# Altium footprint library IS12.01.02.PcbLib: 38 footprints (part 1 of 3)
Each footprint in its own frame and in the unit in brackets; x right, y up, seen from the top. Pads: shape width x height; smd on the part's side, far side on the other; paste and mask are expansions set on the pad; w line width, h text height; cw(c..) or ccw(c..) is an arc to the next point about the centre after c.
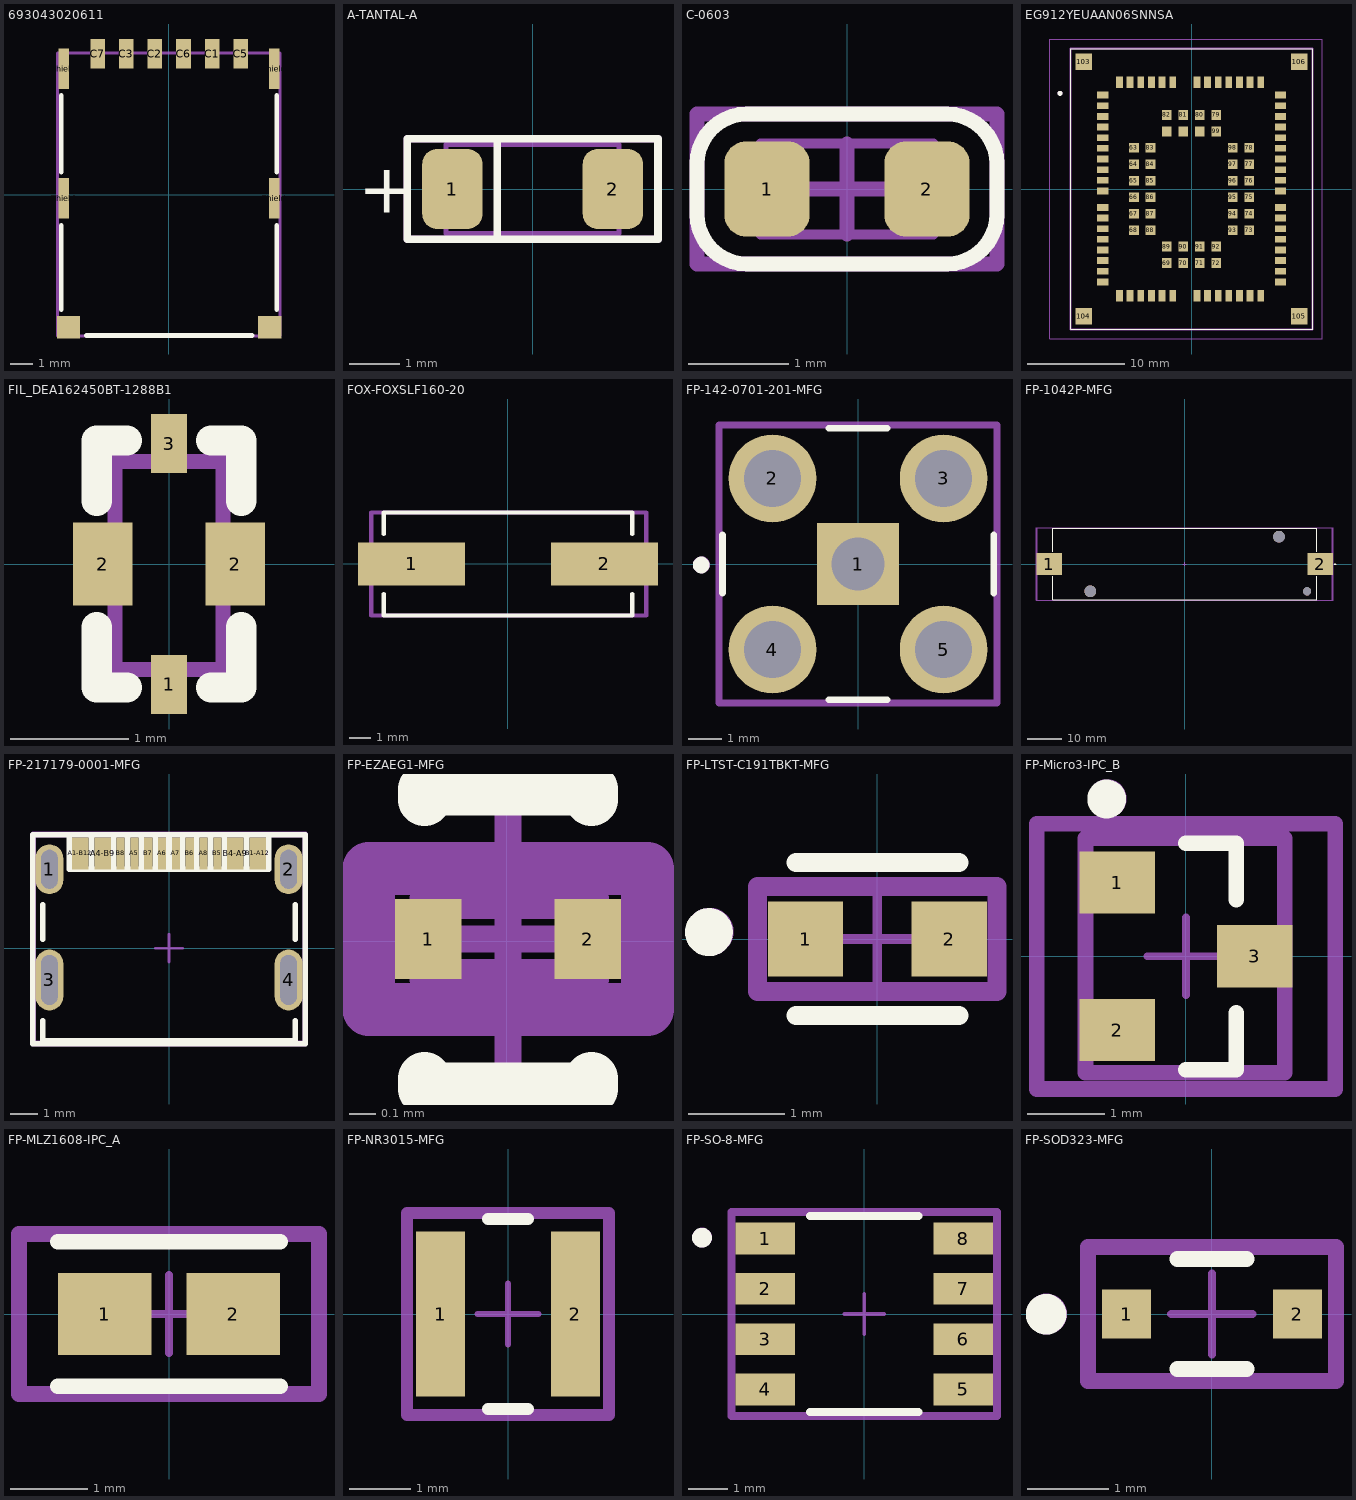
[diagram p0: the footprints below, top view; thin cyan lines are the x and y axes]

## 693043020611 [mm]
pads (12):
  rect 0.65x1.3 smd mask+0.051: C1(1.915,6.25) C2(-0.625,6.25) C3(-1.895,6.25) C5(3.185,6.25) C6(0.645,6.25) C7(-3.165,6.25)
  rect 0.48x1.8 smd mask+0.051: Shield(-4.665,-0.17) Shield(-4.665,5.58) Shield(4.665,-0.17) Shield(4.665,5.58)
  rect 1.03x1 smd mask+0.051: Shield(-4.46,-5.89) Shield(4.47,-5.89)
Top Overlay:
  lines w0.2: -4.775,-5.1 -4.775,-1.35 ; -4.775,1 -4.775,4.4 ; -3.665,-6.25 3.685,-6.25 ; 4.785,-5.1 4.785,-1.35 ; 4.785,1 4.785,4.4
Top Assembly:
  lines w0.127: -4.953,-6.274 4.928,-6.274 4.928,6.274 -4.953,6.274 -4.953,-6.274
3D body "693043020611.stp": height 1.2, standoff -0.01, extent -4.925,-6.25 4.936,6.25

## A-TANTAL-A [mm]
pads (2):
  rrect50% 1.2x1.6 smd mask+0.051: 1(-1.6,0) 2(1.6,0)
Top Overlay:
  lines w0.15: -0.7,-1 -0.7,1 ; -2.5,-1 -2.5,1 2.5,1 2.5,-1 -2.5,-1
  text "+" at -3.479,-0.475 h1
Top Assembly:
  lines w0.1: -1.727,-0.889 -1.727,0.889 1.727,0.889 1.727,-0.889 -1.727,-0.889
  text "+" at -3.479,-0.475 h1
Top Component Outline:
  lines w0.15: -2.5,-1 2.5,-1 2.5,1 -2.5,1 -2.5,-1
3D body "User Library-AVX_ACASE.STEP": height 1.71, standoff 0, extent -1.7,-0.84 1.7,0.84

## C-0603 [mm]
pads (2):
  rrect50% 0.85x0.95 smd: 1(-0.8,0) 2(0.8,0)
Top Overlay:
  lines w0.15: -1.5,-0.25 ccw(c-1,-0.25) -1,-0.75 1,-0.75 ccw(c1,-0.25) 1.5,-0.25 1.5,0.25 ccw(c1,0.25) 1,0.75 -1,0.75 ccw(c-1,0.25) -1.5,0.25 -1.5,-0.25
Top Assembly:
  lines w0.1: -0.864,-0.457 -0.864,0.457 0.864,0.457 0.864,-0.457 -0.864,-0.457
Top Component Outline:
  lines w0.15: -0.45,0 0.45,0 ; 0,-0.45 0,0.45 ; -1.5,-0.75 -1.5,0.75 1.5,0.75 1.5,-0.75 -1.5,-0.75
3D body "CAPC-0603-T0.9-BN.stp": height 0.9, standoff 0, extent -0.85,-0.45 0.85,0.45

## EG912YEUAAN06SNNSA [mm]
pads (106):
  rect 1.15x0.7 smd: 1(-9.175,9.7) 2(-9.175,8.6) 3(-9.175,7.5) 4(-9.175,6.4) 5(-9.175,5.3) 6(-9.175,4.2) 7(-9.175,3.1) 8(-9.175,2) 9(-9.175,0.9) 10(-9.175,-0.2) 11(-9.175,-1.9) 12(-9.175,-3) 13(-9.175,-4.1) 14(-9.175,-5.2) 15(-9.175,-6.3) 16(-9.175,-7.4) 17(-9.175,-8.5) 18(-9.175,-9.6) 32(9.175,-9.6) 33(9.175,-8.5) 34(9.175,-7.4) 35(9.175,-6.3) 36(9.175,-5.2) 37(9.175,-4.1) 38(9.175,-3) 39(9.175,-1.9) 40(9.175,-0.2) 41(9.175,0.9) 42(9.175,2) 43(9.175,3.1) 44(9.175,4.2) 45(9.175,5.3) 46(9.175,6.4) 47(9.175,7.5) 48(9.175,8.6) 49(9.175,9.7)
  rect 0.7x1.15 smd: 19(-7.45,-11.025) 20(-6.35,-11.025) 21(-5.25,-11.025) 22(-4.15,-11.025) 23(-3.05,-11.025) 24(-1.95,-11.025) 25(0.55,-11.025) 26(1.65,-11.025) 27(2.75,-11.025) 28(3.85,-11.025) 29(4.95,-11.025) 30(6.05,-11.025) 31(7.15,-11.025) 50(7.15,11.025) 51(6.05,11.025) 52(4.95,11.025) 53(3.85,11.025) 54(2.75,11.025) 55(1.65,11.025) 56(0.55,11.025) 57(-1.95,11.025) 58(-3.05,11.025) 59(-4.15,11.025) 60(-5.25,11.025) 61(-6.35,11.025) 62(-7.45,11.025)
  rect 1x1 smd: 63(-5.95,4.25) 64(-5.95,2.55) 65(-5.95,0.85) 66(-5.95,-0.85) 67(-5.95,-2.55) 68(-5.95,-4.25) 69(-2.55,-7.65) 70(-0.85,-7.65) 71(0.85,-7.65) 72(2.55,-7.65) 73(5.95,-4.25) 74(5.95,-2.55) 75(5.95,-0.85) 76(5.95,0.85) 77(5.95,2.55) 78(5.95,4.25) 79(2.55,7.65) 80(0.85,7.65) 81(-0.85,7.65) 82(-2.55,7.65) 83(-4.25,4.25) 84(-4.25,2.55) 85(-4.25,0.85) 86(-4.25,-0.85) 87(-4.25,-2.55) 88(-4.25,-4.25) 89(-2.55,-5.95) 90(-0.85,-5.95) 91(0.85,-5.95) 92(2.55,-5.95) 93(4.25,-4.25) 94(4.25,-2.55) 95(4.25,-0.85) 96(4.25,0.85) 97(4.25,2.55) 98(4.25,4.25) 99(2.55,5.95) 100(0.85,5.95) 101(-0.85,5.95) 102(-2.55,5.95)
  rect 1.7x1.7 smd: 103(-11.15,13.15) 104(-11.15,-13.15) 105(11.15,-13.15) 106(11.15,13.15)
Top Overlay:
  circle w0.25: c-13.595,9.876 r0.125
  lines w0.1: -12.5,-14.5 12.5,-14.5 12.5,14.5 -12.5,14.5 -12.5,-14.5
Top Assembly:
  circle w0.25: c-13.589,9.881 r0.125
  lines w0.2: -12.5,-14.5 12.5,-14.5 12.5,14.5 -12.5,14.5 -12.5,-14.5
Mechanical 20:
  lines w0.1: -14.65,-15.5 13.5,-15.5 13.5,15.5 -14.65,15.5 -14.65,-15.5
3D body "EG912YEUAA-N06-SNNSA.STEP": height 2.25, standoff 0, extent -12.5,-14.5 12.5,14.5

## FIL_DEA162450BT-1288B1 [mm]
pads (4):
  rect 0.3x0.5 smd mask+0.05: 1(0,-1.016) 3(0,1.016)
  rect 0.5x0.7 smd mask+0.05: 2(-0.559,0) 2(0.559,0)
Top Overlay:
  lines w0.254: -0.61,-0.533 -0.61,-1.041 -0.356,-1.041 ; -0.61,0.533 -0.61,1.041 -0.356,1.041 ; 0.356,-1.041 0.61,-1.041 0.61,-0.533 ; 0.356,1.041 0.61,1.041 0.61,0.533
Top Assembly:
  lines w0.127: -0.457,-0.889 0.457,-0.889 0.457,0.864 -0.457,0.864 -0.457,-0.889
3D body "DEA-4_1P6X0P8.step": height 0.61, standoff 0, extent -0.47,-0.876 0.47,0.876

## FOX-FOXSLF160-20 [mm]
pads (2):
  rect 5x2 smd: 1(-4.5,0) 2(4.5,0)
Top Overlay:
  lines w0.2: -5.8,-1.4 -5.8,-2.4 0,-2.4 5.8,-2.4 5.8,-1.4 ; -5.8,1.4 -5.8,2.4 0,2.4 5.8,2.4 5.8,1.4
Top Assembly:
  lines w0.2: -6.375,-2.4 6.452,-2.4 6.452,2.4 -6.375,2.4 -6.375,-2.4
3D body "User Library-Crystal HC49_US-SM.STEP": height 4.35, standoff 0.05, extent -6.4,-2.415 6.4,2.415

## FP-142-0701-201-MFG [mil]
pads (5):
  rect 95.46x95.46 hole 62 paste-39370.1 mask+0: 1(0,0)
  round 102.43 hole 67 paste-39370.1 mask+0: 2(-100,100) 3(100,100) 4(-100,-100) 5(100,-100)
Top Overlay:
  circle w9.84: c-183.24,-1.17 r4.92
  lines w7.87: -158.5,-34.02 -158.5,34.02 ; -34.02,-158.5 34.02,-158.5 ; -34.02,158.5 34.02,158.5 ; 158.5,-34.02 158.5,34.02
Top Assembly:
  circle w9.84: c-183,-1 r4.92
  lines w7.87: -162.44,-162.44 162.44,-162.44 162.44,162.44 -162.44,162.44 -162.44,-162.44
Top Courtyard:
  lines w7.87: -162.44,-162.44 162.44,-162.44 162.44,162.44 -162.44,162.44 -162.44,-162.44
Top Component Center:
  lines w3.94: -19.68,0 19.68,0 ; 0,-19.68 0,19.68
3D body "Conn_Cinch_Connectivity_Solutions_142-0701-201_eec.STEP": height 10, standoff 0, extent -162.44,-162.44 162.44,162.44

## FP-1042P-MFG [mil]
pads (5):
  rect 294x255 smd paste+0 mask+0: 1(-1562.5,0) 2(1562.5,0)
  round 135.83 hole 135.83 unplated paste-39370.1 mask+0: ""(-1087.5,-315) ""(1087.5,315)
  round 94 hole 94 unplated paste-39370.1 mask+0: ""(1411.5,-315)
Top Overlay:
  lines w7.87: -1522,-142.13 -1522,-411.5 1522,-411.5 1522,-142.13 ; -1522,142.13 -1522,411.5 1522,411.5 1522,142.13 ; 1725.39,0 1745.08,0 ; 1735.24,-9.84 1735.24,9.84
Top Assembly:
  lines w7.87: -1701,-415.44 -1701,415.44 1704,415.44 1704,-415.44 -1701,-415.44
Top Courtyard:
  lines w7.87: -1713.44,-415.44 -1713.44,415.44 1713.44,415.44 1713.44,-415.44 -1713.44,-415.44
Top Component Center:
  lines w3.94: -19.68,0 19.68,0 ; 0,-19.68 0,19.68
3D body "Batt_Keystone_1042P_eec.STEP": height 594.88, standoff -135, extent -1692.99,-406.54 1693.01,406.5

## FP-217179-0001-MFG [mm]
pads (16):
  rrect100% 1x1.8 hole 1.4 slot 0.6 at 0 deg paste-1000 mask+0.102: 1(-4.32,2.85) 2(4.32,2.85)
  rrect100% 1x2.2 hole 1.8 slot 0.6 at 0 deg paste-1000 mask+0.102: 3(-4.32,-1.15) 4(4.32,-1.15)
  rect 0.6x1.15 smd paste+0 mask+0.051: A1-B12(-3.2,3.425) A4-B9(-2.4,3.425) B1-A12(3.2,3.425) B4-A9(2.4,3.425)
  rect 0.3x1.15 smd paste+0 mask+0.051: A5(-1.25,3.425) A6(-0.25,3.425) A7(0.25,3.425) A8(1.25,3.425) B5(1.75,3.425) B6(0.75,3.425) B7(-0.75,3.425) B8(-1.75,3.425)
Top Overlay:
  lines w0.2: -4.57,-2.625 -4.57,-3.35 4.57,-3.35 4.57,-2.625 ; -4.57,0.325 -4.57,1.575 ; -3.6,4.089 -3.6,2.845 3.6,2.845 3.6,4.089 ; -2.8,2.845 -2.8,4.089 ; -2,2.845 -2,4.089 ; -1.5,2.845 -1.5,4.089 ; -1,2.845 -1,4.089 ; -0.5,2.845 -0.5,4.089 ; 0,2.845 0,4.089 ; 0.5,2.845 0.5,4.089 ; 1,2.845 1,4.089 ; 1.5,2.845 1.5,4.089 ; 2,2.845 2,4.089 ; 2.8,2.845 2.8,4.089 ; 4.57,0.325 4.57,1.575 ; -4.92,-3.45 4.92,-3.45 4.92,4.1 -4.92,4.1 -4.92,-3.45
Top Assembly:
  lines w0.2: -4.92,-3.45 -4.92,4.1 4.92,4.1 4.92,-3.45 -4.92,-3.45
Top Courtyard:
  lines w0.2: -4.912,-3.439 -4.912,4.111 4.928,4.111 4.928,-3.439 -4.912,-3.439
Top Component Center:
  lines w0.1: -0.5,0 0.5,0 ; 0,-0.5 0,0.5
3D body "Conn_Molex_217179-0001_eec.STEP": height 0.25, standoff 0, extent -4.92,-3.45 4.92,4.1

## FP-EZAEG1-MFG [mm]
pads (2):
  rect 0.25x0.3 smd paste+0 mask+0.051: 1(-0.295,0.008) 2(0.305,0.008)
Top Overlay:
  lines w0.2: -0.31,-0.517 -0.31,-0.557 0.32,-0.557 0.32,-0.517 ; -0.31,0.533 -0.31,0.573 0.32,0.573 0.32,0.533
Top Assembly:
  lines w0.15: -0.29,-0.142 -0.29,0.158 0.31,0.158 0.31,-0.142 -0.29,-0.142
Top Courtyard:
  lines w0.2: -0.52,-0.257 -0.52,0.273 0.53,0.273 0.53,-0.257 -0.52,-0.257
Top Component Center:
  lines w0.1: -0.495,0.008 0.505,0.008 ; 0.005,-0.492 0.005,0.508
3D body "Diode_Panasonic_Electronic_Components_EZA-EG1N50AC_eec.STEP": height 0.26, standoff 0, extent -0.295,-0.142 0.305,0.158

## FP-LTST-C191TBKT-MFG [mil]
pads (2):
  rect 31x31 smd paste+0 mask+2: 1(-29.53,0) 2(29.53,0)
Top Overlay:
  circle w9.84: c-69.24,2.83 r4.92
  lines w7.87: -33.46,-31.5 33.46,-31.5 ; -33.46,31.5 33.46,31.5
Top Assembly:
  circle w9.84: c-69,3 r4.92
  lines w7.87: -49.21,-21.65 49.21,-21.65 49.21,21.65 -49.21,21.65 -49.21,-21.65
Top Courtyard:
  lines w7.87: -49.21,-21.65 49.21,-21.65 49.21,21.65 -49.21,21.65 -49.21,-21.65
Top Component Center:
  lines w3.94: -19.68,0 19.68,0 ; 0,-19.68 0,19.68
3D body "Diode_Lite-On_LTST-C191TBKT_eec.STEP": height 10, standoff 0, extent -49.21,-21.65 49.21,21.65

## FP-Micro3-IPC_B [mm]
pads (3):
  rect 0.972x0.802 smd paste+0 mask+0.051: 1(-0.885,0.95) 2(-0.885,-0.95) 3(0.885,0)
Top Overlay:
  circle w0.25: c-1.022,2.028 r0.125
  lines w0.2: 0,-1.46 0.65,-1.46 0.65,-0.73 ; 0,1.46 0.65,1.46 0.65,0.73
Top Assembly:
  circle w0.25: c-1.016,2.032 r0.125
  lines w0.2: -1.295,-1.499 1.27,-1.499 1.27,1.524 -1.295,1.524 -1.295,-1.499
Top Courtyard:
  lines w0.2: -1.922,-1.71 1.922,-1.71 1.922,1.71 -1.922,1.71 -1.922,-1.71
Top Component Center:
  lines w0.1: -0.5,0 0.5,0 ; 0,-0.5 0,0.5
3D body "Trans_Infineon_IRLML2030TRPBF_eec.STEP": height 1.12, standoff 0, extent -1.223,-1.46 1.223,1.46

## FP-MLZ1608-IPC_A [mm]
pads (2):
  rect 1.206x1.058 smd paste+0 mask+0: 1(-0.826,0) 2(0.826,0)
Top Overlay:
  lines w0.2: -1.429,-0.929 1.429,-0.929 ; -1.429,0.929 1.429,0.929
Top Assembly:
  lines w0.2: -1.929,-1.029 -1.929,1.029 1.929,1.029 1.929,-1.029 -1.929,-1.029
Top Courtyard:
  lines w0.2: -1.929,-1.029 -1.929,1.029 1.929,1.029 1.929,-1.029 -1.929,-1.029
Top Component Center:
  lines w0.1: -0.5,0 0.5,0 ; 0,-0.5 0,0.5
3D body "Ind_TDK_MLZ1608A1R0WT000_eec.STEP": height 0.25, standoff 0, extent -1.929,-1.029 1.929,1.029

## FP-NR3015-MFG [mm]
pads (2):
  rect 0.8x2.7 smd paste+0 mask+0: 1(-1.1,0) 2(1.1,0)
Top Overlay:
  lines w0.2: -0.325,-1.55 0.325,-1.55 ; -0.325,1.55 0.325,1.55
Top Assembly:
  lines w0.2: -1.65,-1.65 1.65,-1.65 1.65,1.65 -1.65,1.65 -1.65,-1.65
Top Courtyard:
  lines w0.2: -1.65,-1.65 1.65,-1.65 1.65,1.65 -1.65,1.65 -1.65,-1.65
Top Component Center:
  lines w0.1: -0.5,0 0.5,0 ; 0,-0.5 0,0.5
3D body "Ind_Taiyo_Yuden_NR3015T1R0N_eec.STEP": height 0.25, standoff 0, extent -1.65,-1.65 1.65,1.65

## FP-SO-8-MFG [mm]
pads (8):
  rect 1.505x0.802 smd paste+0 mask+0: 1(-2.498,1.905) 2(-2.498,0.635) 3(-2.498,-0.635) 4(-2.498,-1.905) 5(2.498,-1.905) 6(2.498,-0.635) 7(2.498,0.635) 8(2.498,1.905)
Top Overlay:
  circle w0.25: c-4.096,1.926 r0.125
  lines w0.2: -1.37,-2.475 1.37,-2.475 ; -1.37,2.475 1.37,2.475
Top Assembly:
  circle w0.25: c-4.089,1.93 r0.125
  lines w0.2: -3.35,-2.575 -3.35,2.575 3.35,2.575 3.35,-2.575 -3.35,-2.575
Top Courtyard:
  lines w0.2: -3.35,-2.575 -3.35,2.575 3.35,2.575 3.35,-2.575 -3.35,-2.575
Top Component Center:
  lines w0.1: -0.5,0 0.5,0 ; 0,-0.5 0,0.5
3D body "IC_Diodes_Inc_AZ34063UMTR-G1_eec.STEP": height 0.25, standoff 0, extent -3.35,-2.575 3.35,2.575

## FP-SOD323-MFG [mm]
pads (2):
  rect 0.6x0.6 smd paste+0 mask+0.05: 1(-1.05,0) 2(1.05,0)
Top Overlay:
  circle w0.25: c-2.038,-0.004 r0.125
  lines w0.2: -0.425,-0.675 0.425,-0.675 ; -0.425,0.675 0.425,0.675
Top Paste:
  rectangle: -1.35,-0.25 -0.85,0.25
  rectangle: 0.85,-0.25 1.35,0.25
Top Assembly:
  circle w0.25: c-2.032,0 r0.125
  lines w0.2: -1.525,-0.825 1.525,-0.825 1.525,0.825 -1.525,0.825 -1.525,-0.825
Top Courtyard:
  lines w0.2: -1.525,-0.825 1.525,-0.825 1.525,0.825 -1.525,0.825 -1.525,-0.825
Top Component Center:
  lines w0.1: -0.5,0 0.5,0 ; 0,-0.5 0,0.5
3D body "Diode_Nexperia_BZX384-C5V1_115_eec.STEP": height 0.25, standoff 0, extent -1.525,-0.825 1.525,0.825